# Altium footprint library 元件2.PcbLib: 204 footprints (part 12 of 13)
Each footprint in its own frame and in the unit in brackets; x right, y up, seen from the top. Pads: shape width x height; smd on the part's side, far side on the other; paste and mask are expansions set on the pad; w line width, h text height; cw(c..) or ccw(c..) is an arc to the next point about the centre after c.
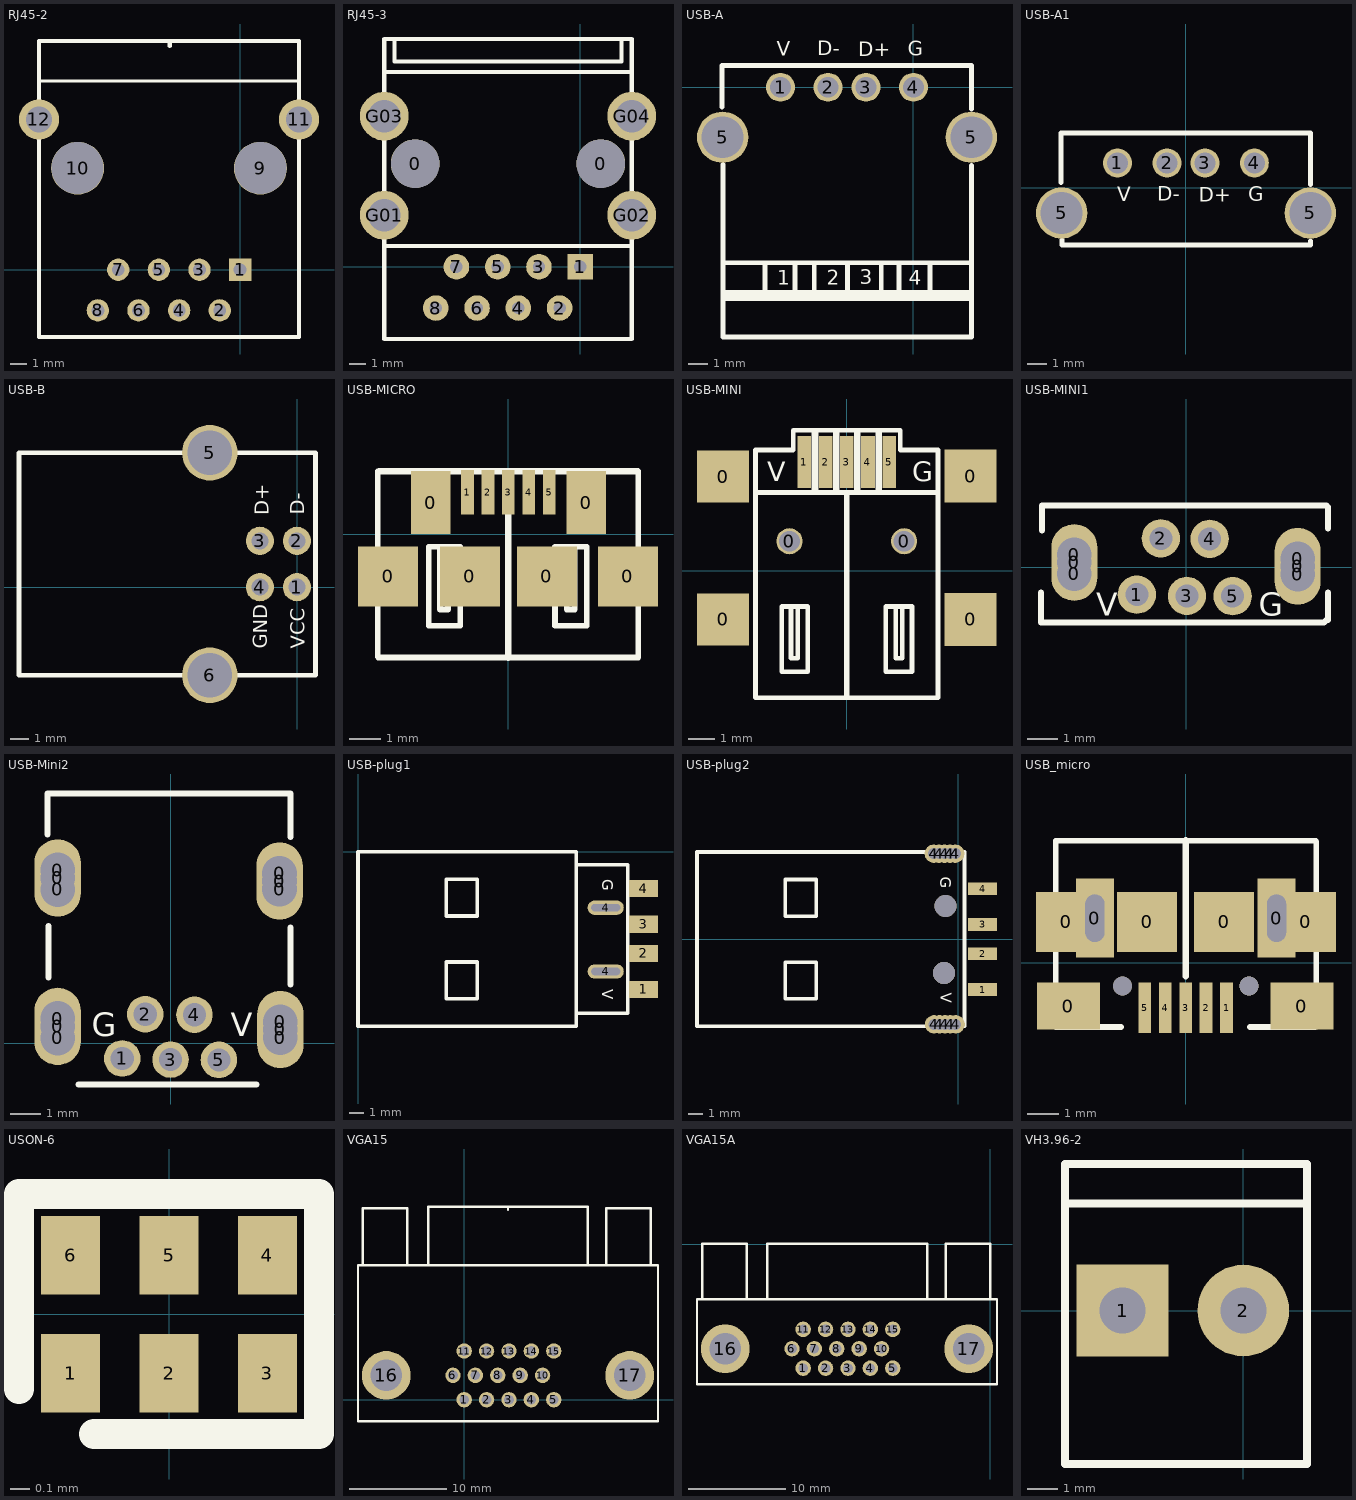
[diagram p11: the footprints below, top view; thin cyan lines are the x and y axes]

## RJ45-2 [mil]
pads (12):
  rect 55x55 hole 31.5: 1(0,0)
  round 55 hole 31.5: 2(-50,-100) 3(-100,0) 4(-150,-100) 5(-200,0) 6(-250,-100) 7(-300,0) 8(-350,-100)
  round 130 hole 127.95 unplated: 9(50,250) 10(-400,250)
  round 98.42 hole 62.99: 11(145,370) 12(-495,370)
Top Overlay:
  lines w8: -488.19,464.57 141.73,464.57
  lines w10: -495,-165.35 144.65,-165.35 145,-165 145,370 145,562.99 -495,562.99 -495,370 -495,-165 ; -173.23,551.18 -173.23,559.06
3D body "Mod-Jack-K122449007-Stig-W.STEP": height 127.85, standoff -555.12, extent -490,-172.17 139.92,556.17

## RJ45-3 [mil]
pads (14):
  round 118.11 hole 118.11: 0(-400,250) 0(50,250)
  rect 62x62 hole 30: 1(0,0)
  round 62 hole 30: 2(-50,-100) 3(-100,0) 4(-150,-100) 5(-200,0) 6(-250,-100) 7(-300,0) 8(-350,-100)
  round 118.11 hole 78.74: G01(-475,125) G02(125,125) G03(-475,365) G04(125,365)
Top Overlay:
  lines w10: -475,50 125,50 ; -475,472.24 125,472.24 ; -450,547.24 -450,497.24 100,497.24 100,547.24 ; -475,-175 -475,500 -475,552.18 125,552.18 125,500 125,-175 -475,-175
3D body "RJ45-8P-Pipe-Cat6.step": height 572.83, standoff -141.73, extent -523,-293.44 169.91,651.44

## USB-A [mm]
pads (6):
  round 1.524 hole 1.1: 1(-7,0) 2(-4.5,0) 3(-2.5,0) 4(0,0)
  round 2.7 hole 2.2: 5(-10.05,-2.635) 5(3.05,-2.635)
Top Overlay:
  lines w0.254: -10.079,-1.041 -10.079,1.143 3.053,1.143 3.053,-1.143 3.053,0.356 ; -10.028,-9.246 3.053,-9.246 ; -10.028,-4.064 -10.028,-13.157 3.053,-13.157 3.053,-4.115 ; -10.002,-11.135 3.053,-11.135 ; -10.002,-10.922 3.053,-10.922 ; -9.875,-10.795 3.053,-10.795 ; -7.818,-10.795 -7.818,-9.246 ; -6.243,-10.795 -6.243,-9.322 ; -5.227,-10.82 -5.227,-9.271 ; -3.475,-10.795 -3.475,-9.322 ; -1.697,-10.897 -1.697,-9.271 ; -0.757,-10.871 -0.757,-9.271 ; 0.869,-10.998 0.869,-9.296
  text "V" at -7.188,1.651 h0.76
  text "G" at -0.305,1.651 h0.76
  text "1" at -7.163,-10.414 h0.76
  text "2" at -4.572,-10.414 h0.76
  text "3" at -2.819,-10.389 h0.76
  text "4" at -0.254,-10.414 h0.76
  text "D+" at -2.896,1.626 h0.76
  text "D-" at -5.08,1.676 h0.76
3D body "Samtec-USBR-A-S-S-O-TH.STEP": height 2.2, standoff -8.65, extent -11.202,-12.979 4.598,1.181

## USB-A1 [mm]
pads (6):
  round 1.524 hole 1.1: 1(-3.612,1.317) 2(-1,1.317) 3(1,1.317) 4(3.602,1.317)
  round 2.7 hole 2.2: 5(-6.55,-1.317) 5(6.55,-1.317)
Top Overlay:
  lines w0.254: -6.579,0.276 -6.579,2.892 6.553,2.892 6.553,0.174 6.553,1.673 ; -6.528,-2.747 -6.528,-3.001 6.553,-3.001 6.553,-2.797
  text "D-" at -1.504,-0.664 h0.76
  text "D+" at 0.681,-0.715 h0.76
  text "G" at 3.271,-0.689 h0.76
  text "V" at -3.612,-0.689 h0.76
3D body "USB-A立式.ste": height 15.5, standoff -3.4, extent -7.587,-3.371 7.475,3.629

## USB-B [mm]
pads (6):
  round 1.524 hole 0.92: 1(-0.02,0.009) 2(-0.02,2.509) 3(-2.02,2.509) 4(-2.02,0.009)
  round 3 hole 2.4: 5(-4.72,7.259) 6(-4.72,-4.741)
Top Overlay:
  lines w0.254: -15.02,-4.741 -15.02,7.259 0.98,7.259 0.98,-4.741 -15.02,-4.741
  text "D-" at 0.381,3.912 h0.76
  text "D+" at -1.549,3.886 h0.76
  text "VCC" at 0.406,-3.302 h0.76
  text "GND" at -1.626,-3.302 h0.76
3D body "USB-B.step": height 11.4, standoff -3.58, extent -15.059,-6.047 1.141,8.435

## USB-MICRO [mm]
pads (11):
  rect 1.9x1.9 smd: 0(-3.797,-1.333) 0(-1.206,-1.333) 0(1.232,-1.333) 0(3.797,-1.333)
  rect 1.25x2 smd: 0(-2.451,1.003) 0(2.476,1.003)
  rect 0.4x1.4 smd: 1(-1.283,1.333) 2(-0.635,1.333) 3(0.013,1.333) 4(0.66,1.333) 5(1.308,1.333)
Top Overlay:
  lines w0.178: -4.127,-3.873 -4.127,1.994 ; -4.102,-3.899 4.102,-3.899 ; -2.152,-0.394 -2.152,-2.379 -1.949,-2.379 -1.898,-2.379 -1.898,-0.394 ; 1.861,-0.394 1.861,-2.379 2.115,-2.379 2.115,-0.394 ; 4.127,-3.899 4.127,1.994 ; -2.513,-2.894 -1.513,-2.894 -1.513,-0.394 -2.513,-0.394 -2.513,-2.894 ; 1.487,-2.894 1.487,-0.394 2.487,-0.394 2.487,-2.894 1.487,-2.894
  lines w0.2: -4.077,1.994 4.102,1.994 ; 0.013,-3.91 0.013,1.968
3D body "MICRO USB.STEP": height 2.77, standoff -0.17, extent -4.1,-3.912 4.1,2.018

## USB-MINI [mm]
pads (11):
  rect 2x2 smd: 0(-4.746,-1.872) 0(-4.746,3.612)
  round 1 hole 0.8: 0(-2.2,1.128) 0(2.2,1.128)
  rect 2x2.032 smd: 0(4.746,-1.872) 0(4.746,3.628)
  rect 0.52x2 smd: 1(-1.626,4.166) 2(-0.813,4.166) 3(0,4.166) 4(0.813,4.166) 5(1.626,4.166)
Top Overlay:
  rectangle: -1.346,3.048 -1.092,5.309
  rectangle: -0.533,3.048 -0.279,5.309
  rectangle: 0.279,3.073 0.533,5.334
  rectangle: 1.092,3.073 1.346,5.334
  lines w0.178: -2.139,-1.372 -2.139,-3.357 -1.936,-3.357 -1.885,-3.357 -1.885,-1.372 ; 1.874,-1.372 1.874,-3.357 2.128,-3.357 2.128,-1.372 ; -3.5,-4.872 3.5,-4.872 3.5,4.628 2.057,4.628 2.057,5.385 0.942,5.385 -2.057,5.385 -2.057,4.628 -2.636,4.628 -3.5,4.628 -3.5,-4.872 ; -2.5,-3.872 -2.5,-1.372 -1.5,-1.372 -1.5,-3.872 -2.5,-3.872 ; 1.5,-3.872 2.5,-3.872 2.5,-1.372 1.5,-1.372 1.5,-3.872
  lines w0.2: -3.464,3.001 3.486,3.001 ; 0,-4.851 0,2.997
  text "G" at 2.515,3.429 h0.76
  text "V" at -3.048,3.429 h0.76
3D body "miniUSB-DIP.STEP": height 3.95, standoff -1, extent -5.315,-4.625 5.385,4.575

## USB-MINI1 [mil]
pads (11):
  round 50 hole 45: 0(-145.62,-8.59) 0(-145.62,16.34) 0(145.62,-9.22) 0(145.62,11.09)
  oval 60x100 hole 45: 0(-145.62,6.28) 0(145.62,1.28)
  round 50 hole 30: 1(-64.06,-35.78) 2(-32.81,37.66) 3(1.25,-37.34) 4(30.94,37.03) 5(60.94,-37.66)
Top Overlay:
  lines w7.87: -188.94,-32.72 -188.94,-71.72 180.06,-71.72 183.06,-68.72 185.06,-68.72 185.06,-32.72 ; -187.94,48.28 -187.94,80.28 183.06,80.28 185.06,78.28 185.06,50.28
  text "V" at -117,-63 h30
  text "G" at 95,-63 h30
3D body "usb_a-usb_b-m5-top.stp": height 393.7, standoff -84.65, extent -200.73,-74.3 200.85,79.28

## USB-Mini2 [mil]
pads (17):
  round 50 hole 45: 0(-146,7.12) 0(-146,32.06) 0(-146,199.12) 0(-146,224.06) 0(141,199.5) 0(141,219.81) 0(142,7.5) 0(142,27.81)
  oval 60x100 hole 45: 0(-146,22) 0(-146,214) 0(141,210) 0(142,18)
  round 47.24 hole 30: 1(-62.5,-19.44) 2(-32.81,37.66) 3(0,-21) 4(30.94,37.03) 5(62.5,-21.31)
Top Overlay:
  lines w7.87: -159,270 -159,323 155,323 155,267 ; -158,85 -158,152 ; -119,-53 111,-53 ; 155,76 155,150
  text "V" at 78,9 h30
  text "G" at -102,9 h30
3D body "5877.stp": height 155.51, standoff -70.87, extent -153.58,-34 149.57,320.33

## USB-plug1 [mm]
pads (6):
  rect 2x1.2 smd: 1(19.761,-9.525) 2(19.761,-7.036) 3(19.761,-5.004) 4(19.761,-2.54)
  oval 2.5x1 hole 0.5 slot 2 at 0 deg: 4(17.145,-8.28) 4(17.145,-3.861)
Top Overlay:
  lines w0.254: 0,-12.065 15.113,-12.065 15.113,-4.191 15.113,0 0,0 0,-12.065 ; 6.096,-10.16 8.255,-10.16 8.255,-7.62 6.096,-7.62 6.096,-10.16 ; 6.096,-4.445 6.096,-1.905 8.255,-1.905 8.255,-4.445 6.096,-4.445 ; 15.113,-11.176 18.669,-11.176 18.669,-0.889 15.113,-0.889 15.113,-10.033 15.113,-11.176
  text "V" at 16.891,-9.525 h0.76
  text "G" at 16.891,-1.905 h0.76
Keep-Out Layer:
  lines w0.051: 16.154,-4.089 18.085,-4.089 18.085,-3.581 17.932,-3.581 16.383,-3.581 16.154,-3.581 16.154,-4.089 ; 16.205,-8.509 16.205,-8.001 16.434,-8.001 17.983,-8.001 18.136,-8.001 18.136,-8.509 16.205,-8.509
3D body "User Library-usbap-1p.step": height 2.22, standoff -2.27, extent 0.211,-12.076 20.211,-0.076

## USB-plug2 [mil]
height 93.7
pads (17):
  rect 78.74x35 smd: 1(66.5,-138.04) 2(66.5,-40.04) 3(66.5,39.96) 4(66.5,136.96)
  round 50 hole 30: 4(-66.5,232.5) 4(-66.5,232.5) 4(-65.58,-232.5) 4(-51.79,232.5) 4(-50.84,-232.5) 4(-37.08,232.5) 4(-36.1,-232.5) 4(-22.38,232.5) 4(-22.38,232.5) 4(-21.36,-232.5) 4(-7.67,232.5) 4(-7.67,232.5) 4(-6.63,-232.5)
via -38.5,-92.21 diameter 60 hole 60
via -34.75,90.29 diameter 60 hole 60
Top Overlay:
  lines w10: -711.5,-238.04 -711.5,236.96 -116.5,236.96 17.5,236.96 17.5,-238.04 -711.5,-238.04 ; -471.5,-163.04 -471.5,-63.04 -386.5,-63.04 -386.5,-163.04 -471.5,-163.04 ; -471.5,61.96 -386.5,61.96 -386.5,161.96 -471.5,161.96 -471.5,61.96
  text "G" at -48.5,169.96 h30
  text "V" at -47.5,-147.04 h30
3D body "User Library-usbap-1p.step": height 87.6, standoff -89.57, extent -703.2,-238.48 84.2,233.96

## USB_micro [mm]
pads (13):
  rect 1.9x1.9 smd: 0(-3.797,1.302) 0(-1.232,1.302) 0(1.207,1.302) 0(3.797,1.302)
  rect 2x1.5 smd: 0(-3.721,-1.365) 0(3.67,-1.365)
  rect 1.2x2.5 hole 0.6 slot 1.5 at 90 deg: 0(-2.885,1.416) 0(2.865,1.416)
  rect 0.4x1.6 smd: 1(1.283,-1.416) 2(0.635,-1.416) 3(-0.013,-1.416) 4(-0.66,-1.416) 5(-1.308,-1.416)
via -2.006,-0.734 diameter 0.6 hole 0.6
via 1.994,-0.734 diameter 0.6 hole 0.6
Top Overlay:
  lines w0.178: -4.127,-2.025 -4.127,3.867 ; -4.102,3.867 4.102,3.867 ; 4.128,-2.025 4.128,3.842
  lines w0.2: -4.102,-2.025 -2.057,-2.025 ; -0.013,-0.425 -0.013,3.879 ; 2.032,-2.025 4.077,-2.025
3D body "MICRO USB.STEP": height 2.77, standoff -0.17, extent -4.1,-2.05 4.1,3.88

## USON-6 [mm]
pads (6):
  rect 0.3x0.4 smd: 1(-0.5,-0.3) 2(0,-0.3) 3(0.5,-0.3) 4(0.5,0.3) 5(0,0.3) 6(-0.5,0.3)
Top Overlay:
  lines w0.152: -0.762,-0.381 -0.762,0.612 ; -0.762,0.61 0.762,0.61 0.762,-0.61 -0.381,-0.61
3D body "USON-6.STEP": height 0.6, standoff 0, extent -0.745,-0.537 0.755,0.533

## VGA15 [mm]
pads (17):
  round 1.58 hole 1: 1(0,0) 2(2.3,0) 3(4.6,0) 4(6.9,0) 5(9.2,0) 6(-1.15,2.5) 7(1.15,2.5) 8(3.45,2.5) 9(5.75,2.5) 10(8.05,2.5) 11(0,5) 12(2.3,5) 13(4.6,5) 14(6.9,5) 15(9.2,5)
  round 5 hole 3.25: 16(-8,2.5) 17(17,2.5)
Top Overlay:
  lines w0.254: -10.9,-2.2 -10.9,13.8 19.9,13.8 19.9,-2.2 -10.89,-2.2 -10.9,-2.19 ; -10.4,13.8 -10.4,19.67 -5.83,19.67 -5.83,13.82 ; -3.7,13.8 -3.7,19.8 12.7,19.8 12.7,13.8 ; 4.5,19.5 4.5,19.8 ; 14.6,13.8 14.6,19.68 19.18,19.68 19.18,13.84
3D body "SW3dPS-Connector, D-Sub, 15 pin HD, RA, Receptacle.STEP": height 12.77, standoff -3.27, extent -11.055,-0.875 19.755,20.225

## VGA15A [mm]
pads (17):
  round 1.58 hole 1: 1(-19.205,-12.725) 2(-16.905,-12.725) 3(-14.605,-12.725) 4(-12.305,-12.725) 5(-10.005,-12.725) 6(-20.355,-10.733) 7(-18.055,-10.733) 8(-15.755,-10.733) 9(-13.455,-10.733) 10(-11.155,-10.733) 11(-19.205,-8.741) 12(-16.905,-8.741) 13(-14.605,-8.741) 14(-12.305,-8.741) 15(-10.005,-8.741)
  round 5 hole 3.25: 16(-27.205,-10.733) 17(-2.205,-10.733)
Top Overlay:
  lines w0.254: -29.58,-5.664 -29.58,0.025 -25.01,0.025 -25.01,-5.664 ; -22.88,-5.588 -22.88,0.025 -6.48,0.025 -6.48,-5.664 ; -4.58,-5.639 -4.58,0.025 0,0.025 0,-5.639 ; -30.105,-14.354 -30.105,-5.664 0.695,-5.664 0.695,-14.354 -30.105,-14.354
3D body "User Library-SLIM D-SUB RIGHT ANGLE PCB MOUNT.step": height 10.25, standoff -3.09, extent -30.008,-13.801 0.792,-0.331

## VH3.96-2 [mm]
height 3.5
pads (2):
  rect 3x3 hole 1.5 square: 1(-3.96,0)
  round 3 hole 1.5 square: 2(0,0)
Top Overlay:
  lines w0.254: -5.842,3.505 2.057,3.505 ; -5.842,-5.029 -5.842,4.801 2.083,4.801 2.083,-5.029 -5.842,-5.029
3D body "VH2.stp": height 14.83, standoff -3.46, extent -5.816,-5.08 1.956,4.928